# Altium footprint library Supernova Connectors.PcbLib: 303 footprints (part 6 of 19)
Each footprint in its own frame and in the unit in brackets; x right, y up, seen from the top. Pads: shape width x height; smd on the part's side, far side on the other; paste and mask are expansions set on the pad; w line width, h text height; cw(c..) or ccw(c..) is an arc to the next point about the centre after c.
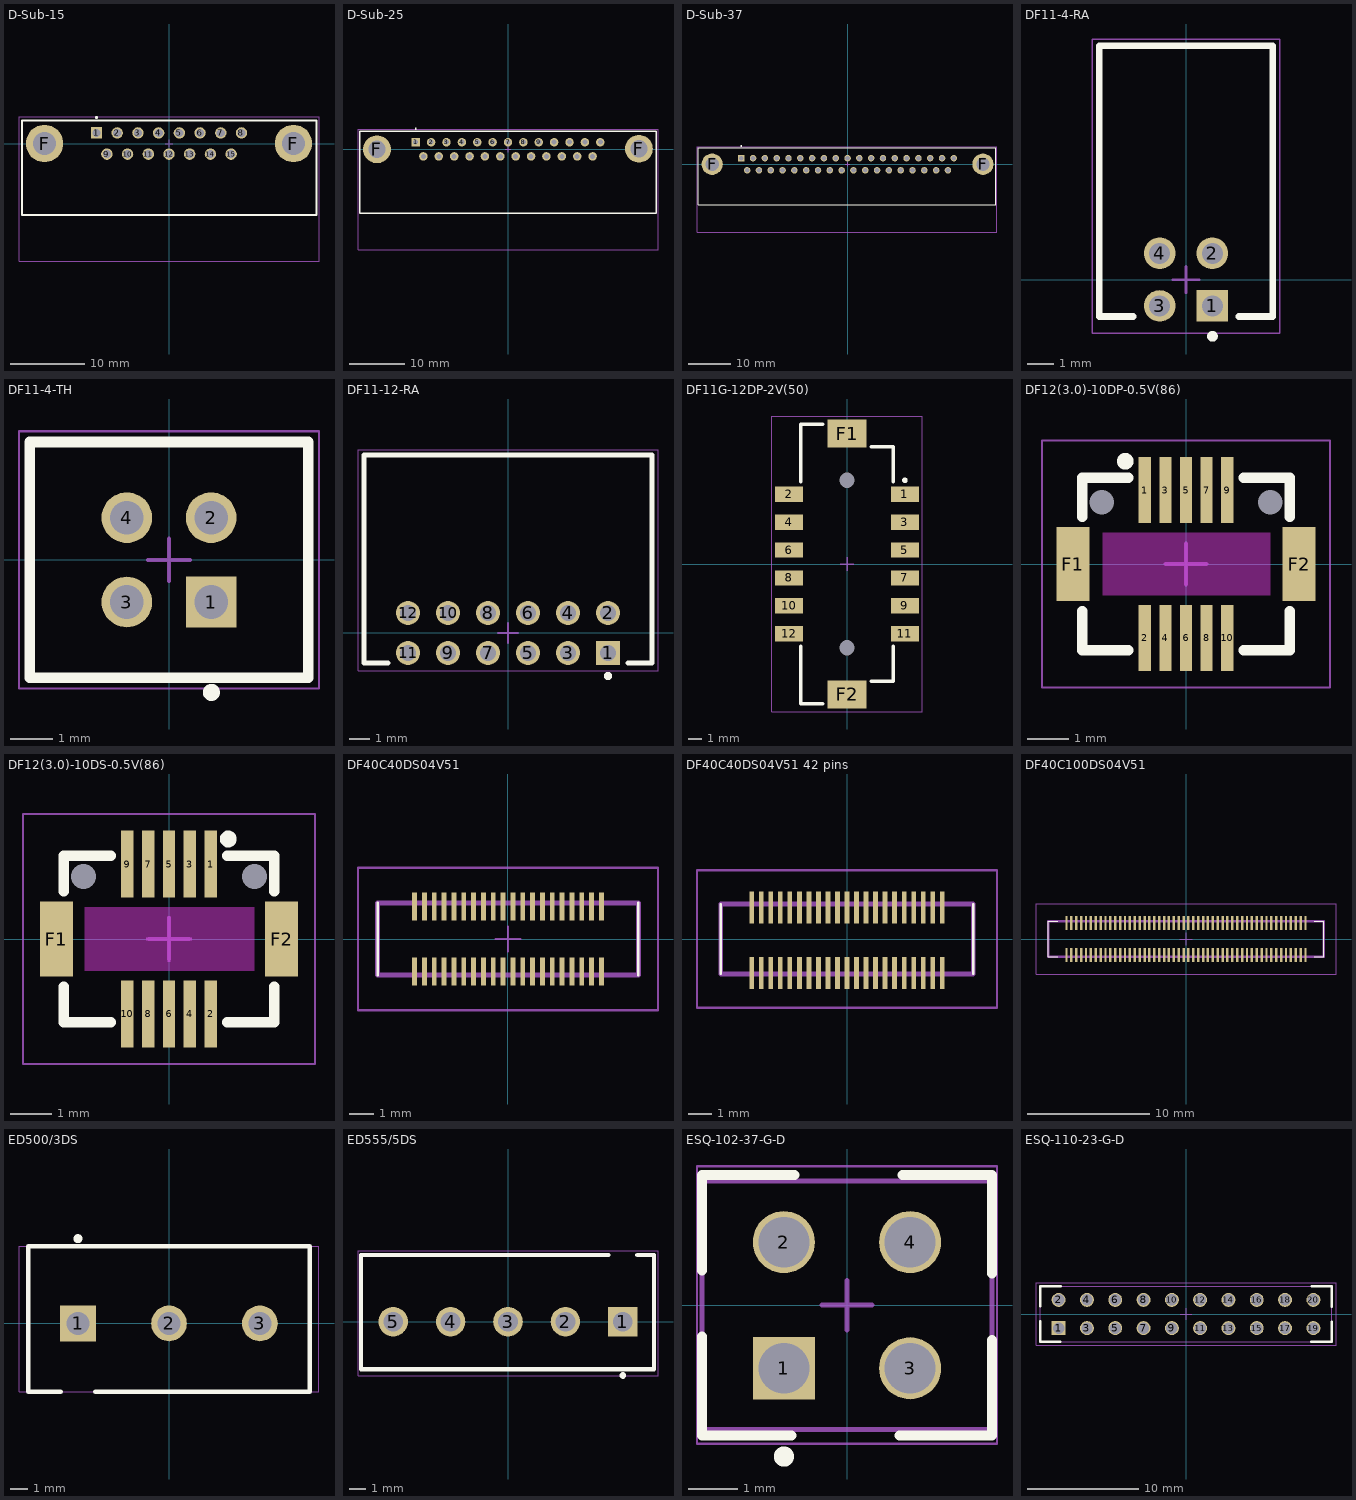
[diagram p5: the footprints below, top view; thin cyan lines are the x and y axes]

## D-Sub-15 [mm]
pads (17):
  rect 1.524x1.524 hole 1.1: 1(-9.695,1.42)
  round 1.524 hole 1.1: 2(-6.925,1.42) 3(-4.155,1.42) 4(-1.385,1.42) 5(1.385,1.42) 6(4.155,1.42) 7(6.925,1.42) 8(9.695,1.42) 9(-8.31,-1.42) 10(-5.54,-1.42) 11(-2.77,-1.42) 12(0,-1.42) 13(2.77,-1.42) 14(5.54,-1.42) 15(8.31,-1.42)
  round 5 hole 3.1: F(-16.65,0) F(16.65,0)
Top Overlay:
  circle w0.203: c-9.695,3.478 r0.102
  lines w0.254: -19.69,-9.55 -19.69,3.073 19.71,3.073 19.71,-9.55 -19.69,-9.55
Top Courtyard:
  lines w0.05: -20.066,-15.748 20.066,-15.748 20.066,3.556 -20.066,3.556 -20.066,-15.748
  lines w0.1: -0.5,0 0.5,0 ; 0,-0.5 0,0.5
3D body "182-015-113.STEP": height 12.55, standoff -3.17, extent -19.557,-15.545 19.585,2.946

## D-Sub-25 [mm]
pads (27):
  rect 1.524x1.524 hole 0.9: 1(-16.56,1.27)
  round 1.524 hole 0.9: 2(-13.8,1.27) 3(-11.04,1.27) 4(-8.28,1.27) 5(-5.52,1.27) 6(-2.76,1.27) 7(0,1.27) 8(2.76,1.27) 9(5.52,1.27) 10(8.28,1.27) 11(11.04,1.27) 12(13.8,1.27) 13(16.56,1.27) 14(-15.18,-1.27) 15(-12.42,-1.27) 16(-9.66,-1.27) 17(-6.9,-1.27) 18(-4.14,-1.27) 19(-1.38,-1.27) 20(1.38,-1.27) 21(4.14,-1.27) 22(6.9,-1.27) 23(9.66,-1.27) 24(12.42,-1.27) 25(15.18,-1.27)
  round 5 hole 3.1: F(-23.52,0) F(23.5,0.1)
Top Overlay:
  circle w0.203: c-16.56,3.678 r0.102
  lines w0.254: -26.6,-11.5 26.6,-11.5 26.6,3.2 -26.6,3.2 -26.6,-11.5
Top Courtyard:
  lines w0.05: -26.924,-18.034 -26.924,3.556 26.924,3.556 26.924,-18.034 -26.924,-18.034
  lines w0.1: -0.5,0 0.5,0 ; 0,-0.5 0,0.5
3D body "sd25p13a4gv00lf.stp": height 13.55, standoff -3.1, extent -26.52,-17.75 26.52,3.15

## D-Sub-37 [mm]
pads (39):
  rect 1.524x1.524 hole 1.1: 1(-24.93,1.42)
  round 1.524 hole 1.1: 2(-22.16,1.42) 3(-19.39,1.42) 4(-16.62,1.42) 5(-13.85,1.42) 6(-11.08,1.42) 7(-8.31,1.42) 8(-5.54,1.42) 9(-2.77,1.42) 10(0,1.42) 11(2.77,1.42) 12(5.54,1.42) 13(8.31,1.42) 14(11.08,1.42) 15(13.85,1.42) 16(16.62,1.42) 17(19.39,1.42) 18(22.16,1.42) 19(24.93,1.42) 20(-23.545,-1.42) 21(-20.775,-1.42) 22(-18.005,-1.42) 23(-15.235,-1.42) 24(-12.465,-1.42) 25(-9.695,-1.42) 26(-6.925,-1.42) 27(-4.155,-1.42) 28(-1.385,-1.42) 29(1.385,-1.42) 30(4.155,-1.42) 31(6.925,-1.42) 32(9.695,-1.42) 33(12.465,-1.42) 34(15.235,-1.42) 35(18.005,-1.42) 36(20.775,-1.42) 37(23.545,-1.42)
  round 5 hole 3.1: F(-31.75,0) F(31.75,0)
Top Overlay:
  circle w0.203: c-24.93,4.278 r0.102
  lines w0.254: 34.773,-9.55 -35.052,-9.55 -35.052,3.81 34.81,3.81 34.81,-9.55
Top Courtyard:
  lines w0.05: -35.306,-16.002 -35.306,4.064 35.052,4.064 35.052,-16.002 -35.306,-16.002
  lines w0.1: -0.5,0 0.5,0 ; 0,-0.5 0,0.5
3D body "182-037-113.STEP": height 12.55, standoff -3.17, extent -34.792,-15.697 34.525,3.454

## DF11-4-RA [mm]
pads (4):
  rect 1.2x1.2 hole 0.8: 1(1,-1)
  round 1.2 hole 0.8: 2(1,1) 3(-1,-1) 4(-1,1)
Top Overlay:
  circle w0.203: c1.004,-2.156 r0.102
  lines w0.254: -2,-1.4 -3.302,-1.4 -3.302,8.89 3.302,8.89 3.302,-1.4 2,-1.4
Top Courtyard:
  lines w0.05: -3.556,-2.032 3.556,-2.032 3.556,9.144 -3.556,9.144 -3.556,-2.032
  lines w0.1: -0.5,0 0.5,0 ; 0,-0.5 0,0.5
3D body "DF11-4DP-2DS_X_8A_S_H_X_97_S__.STEP": height 5.01, standoff -2.99, extent -3.025,-1.3 2.975,8.7

## DF11-4-TH [mm]
pads (4):
  rect 1.2x1.2 hole 0.8: 1(1,-1)
  round 1.2 hole 0.8: 2(1,1) 3(-1,-1) 4(-1,1)
Top Overlay:
  circle w0.203: c1.005,-3.143 r0.102
  lines w0.254: -3.302,-2.794 -1.706,-2.794 3.302,-2.794 3.302,2.794 -3.302,2.794 -3.302,-2.794
Top Courtyard:
  lines w0.05: -3.556,-3.048 -3.556,3.048 3.556,3.048 3.556,-3.048 -3.556,-3.048
  lines w0.1: -0.5,0 0.5,0 ; 0,-0.5 0,0.5
3D body "DF11-4DP-2DSA.stp": height 6.63, standoff -2.97, extent -3,-2.5 3,2.5

## DF11-12-RA [mm]
pads (12):
  rect 1.2x1.2 hole 0.8: 1(5,-1)
  round 1.2 hole 0.8: 2(5,1) 3(3,-1) 4(3,1) 5(1,-1) 6(1,1) 7(-1,-1) 8(-1,1) 9(-3,-1) 10(-3,1) 11(-5,-1) 12(-5,1)
Top Overlay:
  circle w0.203: c5.004,-2.156 r0.102
  lines w0.254: -6,-1.5 -7.2,-1.5 -7.2,8.89 7.2,8.89 7.2,-1.5 6,-1.5
Top Courtyard:
  lines w0.05: -7.5,-1.9 7.5,-1.9 7.5,9.144 -7.5,9.144 -7.5,-1.9
  lines w0.1: -0.5,0 0.5,0 ; 0,-0.5 0,0.5
3D body "DF11-12DP-2DS.stp": height 5.06, standoff -2.94, extent -7,-1.325 7,8.675

## DF11G-12DP-2V(50) [mm]
pads (16):
  rect 2x1.1 smd: 1(4.15,5) 2(-4.15,5) 3(4.15,3) 4(-4.15,3) 5(4.15,1) 6(-4.15,1) 7(4.15,-1) 8(-4.15,-1) 9(4.15,-3) 10(-4.15,-3) 11(4.15,-5) 12(-4.15,-5)
  rect 2.8x2 smd paste-0.2: F1(0,9.35) F2(0,-9.35)
  round 0 hole 1.1 unplated: ""(0,-6) ""(0,6)
Top Overlay:
  circle w0.203: c4.15,6 r0.102
  lines w0.254: -3.3,-5.9 -3.3,-10 -1.75,-10 ; -3.3,5.9 -3.3,10 -1.75,10 ; 1.75,-8.4 3.3,-8.4 3.3,-5.9 ; 1.75,8.4 3.3,8.4 3.3,5.9
Top Courtyard:
  lines w0.05: -5.4,-10.6 -5.4,10.6 5.4,10.6 5.4,-10.6 -5.4,-10.6
  lines w0.1: -0.5,0 0.5,0 ; 0,-0.5 0,0.5
3D body "DF11G-12DP-2V.stp": height 7.21, standoff -0.99, extent -4.6,-9.85 4.6,9.85

## DF12(3.0)-10DP-0.5V(86) [mm]
pads (14):
  rect 0.3x1.6 smd paste-1 mask+0.025: 1(-1,1.8) 2(-1,-1.8) 3(-0.5,1.8) 4(-0.5,-1.8) 5(0,1.8) 6(0,-1.8) 7(0.5,1.8) 8(0.5,-1.8) 9(1,1.8) 10(1,-1.8)
  rect 0.8x1.8 smd paste-0.05 mask+0.025: F1(-2.75,0) F2(2.75,0)
  round 0.2 hole 0.6 unplated: ""(-2.05,1.5) ""(2.05,1.5)
Top Layer keep-out:
  rectangle: -2.032,-0.762 2.057,0.762
Top Overlay:
  circle w0.203: c-1.478,2.5 r0.102
  lines w0.254: -2.525,-1.15 -2.525,-2.1 -1.4,-2.1 ; -2.525,1.15 -2.525,2.1 -1.4,2.1 ; 1.4,-2.1 2.525,-2.1 2.525,-1.15 ; 1.4,2.1 2.525,2.1 2.525,1.15
Top Paste:
  region: 1.14,-1.4 0.86,-1.4 0.86,-2.6 1.14,-2.6
  region: 0.64,-1.4 0.36,-1.4 0.36,-2.6 0.64,-2.6
  region: 0.14,-1.4 -0.14,-1.4 -0.14,-2.6 0.14,-2.6
  region: -0.36,-1.4 -0.64,-1.4 -0.64,-2.6 -0.36,-2.6
  region: -0.86,-1.4 -1.14,-1.4 -1.14,-2.6 -0.86,-2.6
  rectangle: -1.14,1.4 -0.86,2.6
  rectangle: -0.64,1.4 -0.36,2.6
  rectangle: 0.86,1.4 1.14,2.6
  rectangle: 0.36,1.4 0.64,2.6
  rectangle: -0.14,1.4 0.14,2.6
Top Courtyard:
  lines w0.05: -3.5,-3 -3.5,3 3.5,3 3.5,-3 -3.5,-3
  lines w0.1: -0.5,0 0.5,0 ; 0,-0.5 0,0.5
3D body "DF12(3.0)-10DP-0.5V.stp": height 2.3, standoff -0.6, extent -2.8,-2.289 2.8,2.311

## DF12(3.0)-10DS-0.5V(86) [mm]
pads (14):
  rect 0.3x1.6 smd paste-1 mask+0.025: 1(1,1.8) 2(1,-1.8) 3(0.5,1.8) 4(0.5,-1.8) 5(0,1.8) 6(0,-1.8) 7(-0.5,1.8) 8(-0.5,-1.8) 9(-1,1.8) 10(-1,-1.8)
  rect 0.8x1.8 smd paste-0.05 mask+0.025: F1(-2.7,0) F2(2.7,0)
  round 0.2 hole 0.6 unplated: ""(-2.05,1.5) ""(2.05,1.5)
Top Layer keep-out:
  rectangle: -2.032,-0.762 2.057,0.762
Top Overlay:
  circle w0.203: c1.422,2.4 r0.102
  lines w0.254: -2.525,-1.15 -2.525,-2 -1.4,-2 ; -2.525,1.15 -2.525,2 -1.4,2 ; 1.4,-2 2.525,-2 2.525,-1.15 ; 1.4,2 2.525,2 2.525,1.15
Top Paste:
  region: 0.14,2.6 -0.14,2.6 -0.14,1.4 0.14,1.4
  region: -0.36,2.6 -0.64,2.6 -0.64,1.4 -0.36,1.4
  region: -0.86,2.6 -1.14,2.6 -1.14,1.4 -0.86,1.4
  region: 0.64,2.6 0.36,2.6 0.36,1.4 0.64,1.4
  region: 1.14,2.6 0.86,2.6 0.86,1.4 1.14,1.4
  rectangle: 0.86,-2.6 1.14,-1.4
  rectangle: 0.36,-2.6 0.64,-1.4
  rectangle: -0.14,-2.6 0.14,-1.4
  rectangle: -0.64,-2.6 -0.36,-1.4
  rectangle: -1.14,-2.6 -0.86,-1.4
Top Courtyard:
  lines w0.05: -3.5,-3 3.5,-3 3.5,3 -3.5,3 -3.5,-3
  lines w0.1: -0.5,0 0.5,0 ; 0,-0.5 0,0.5
3D body "DF12(3.0)-10DS-0.5V.stp": height 2.2, standoff -0.6, extent -2.8,-2.3 2.8,2.3

## DF40C40DS04V51 [mm]
pads (40):
  rect 0.2x1.14 smd mask+0.025: 1(-3.8,-1.32) 2(-3.8,1.32) 3(-3.4,-1.32) 4(-3.4,1.32) 5(-3,-1.32) 6(-3,1.32) 7(-2.6,-1.32) 8(-2.6,1.32) 9(-2.2,-1.32) 10(-2.2,1.32) 11(-1.8,-1.32) 12(-1.8,1.32) 13(-1.4,-1.32) 14(-1.4,1.32) 15(-1,-1.32) 16(-1,1.32) 17(-0.6,-1.32) 18(-0.6,1.32) 19(-0.2,-1.32) 20(-0.2,1.32) 21(0.2,-1.32) 22(0.2,1.32) 23(0.6,-1.32) 24(0.6,1.32) 25(1,-1.32) 26(1,1.32) 27(1.4,-1.32) 28(1.4,1.32) 29(1.8,-1.32) 30(1.8,1.32) 31(2.2,-1.32) 32(2.2,1.32) 33(2.6,-1.32) 34(2.6,1.32) 35(3,-1.32) 36(3,1.32) 37(3.4,-1.32) 38(3.4,1.32) 39(3.8,-1.32) 40(3.8,1.32)
Top Overlay:
  lines w0.1: -5.3,-1.47 -5.3,1.47 ; 5.3,-1.47 5.3,1.47
Top 3D Body:
  lines w0.2: -5.3,-1.47 5.3,-1.47 5.3,1.47 -5.3,1.47 -5.3,-1.47
Top Courtyard:
  lines w0.1: -0.5,0 0.5,0 ; 0,-0.5 0,0.5 ; -6.1,-2.89 6.1,-2.89 6.1,2.89 -6.1,2.89 -6.1,-2.89
3D body "DF40C-40DS.stp": height 1.4, standoff -0.05, extent -5.315,-1.69 5.285,1.69

## DF40C40DS04V51 42 pins [mm]
pads (42):
  rect 0.2x1.34 smd mask+0.025: 1(-4,-1.42) 2(-4,1.32) 3(-3.6,-1.42) 4(-3.6,1.32) 5(-3.2,-1.42) 6(-3.2,1.32) 7(-2.8,-1.42) 8(-2.8,1.32) 9(-2.4,-1.42) 10(-2.4,1.32) 11(-2,-1.42) 12(-2,1.32) 13(-1.6,-1.42) 14(-1.6,1.32) 15(-1.2,-1.42) 16(-1.2,1.32) 17(-0.8,-1.42) 18(-0.8,1.32) 19(-0.4,-1.42) 20(-0.4,1.32) 21(0,-1.42) 22(0,1.32) 23(0.4,-1.42) 24(0.4,1.32) 25(0.8,-1.42) 26(0.8,1.32) 27(1.2,-1.42) 28(1.2,1.32) 29(1.6,-1.42) 30(1.6,1.32) 31(2,-1.42) 32(2,1.32) 33(2.4,-1.42) 34(2.4,1.32) 35(2.8,-1.42) 36(2.8,1.32) 37(3.2,-1.42) 38(3.2,1.32) 39(3.6,-1.42) 40(3.6,1.32) 41(4,-1.42) 42(4,1.32)
Top Overlay:
  lines w0.1: -5.3,-1.47 -5.3,1.47 ; 5.3,-1.47 5.3,1.47
Top 3D Body:
  lines w0.2: -5.3,-1.47 -5.3,1.47 5.3,1.47 5.3,-1.47 -5.3,-1.47
Top Courtyard:
  lines w0.1: -6.3,-2.89 -6.3,2.89 6.3,2.89 6.3,-2.89 -6.3,-2.89
3D body "DF40C-40DS-0.4V_51_.stp": height 1.75, standoff 0, extent -5.3,-1.87 5.3,1.87

## DF40C100DS04V51 [mm]
pads (100):
  rect 0.2x1.14 smd mask+0.025: 1(-9.8,-1.32) 2(-9.8,1.32) 3(-9.4,-1.32) 4(-9.4,1.32) 5(-9,-1.32) 6(-9,1.32) 7(-8.6,-1.32) 8(-8.6,1.32) 9(-8.2,-1.32) 10(-8.2,1.32) 11(-7.8,-1.32) 12(-7.8,1.32) 13(-7.4,-1.32) 14(-7.4,1.32) 15(-7,-1.32) 16(-7,1.32) 17(-6.6,-1.32) 18(-6.6,1.32) 19(-6.2,-1.32) 20(-6.2,1.32) 21(-5.8,-1.32) 22(-5.8,1.32) 23(-5.4,-1.32) 24(-5.4,1.32) 25(-5,-1.32) 26(-5,1.32) 27(-4.6,-1.32) 28(-4.6,1.32) 29(-4.2,-1.32) 30(-4.2,1.32) 31(-3.8,-1.32) 32(-3.8,1.32) 33(-3.4,-1.32) 34(-3.4,1.32) 35(-3,-1.32) 36(-3,1.32) 37(-2.6,-1.32) 38(-2.6,1.32) 39(-2.2,-1.32) 40(-2.2,1.32) 41(-1.8,-1.32) 42(-1.8,1.32) 43(-1.4,-1.32) 44(-1.4,1.32) 45(-1,-1.32) 46(-1,1.32) 47(-0.6,-1.32) 48(-0.6,1.32) 49(-0.2,-1.32) 50(-0.2,1.32) 51(0.2,-1.32) 52(0.2,1.32) 53(0.6,-1.32) 54(0.6,1.32) 55(1,-1.32) 56(1,1.32) 57(1.4,-1.32) 58(1.4,1.32) 59(1.8,-1.32) 60(1.8,1.32) 61(2.2,-1.32) 62(2.2,1.32) 63(2.6,-1.32) 64(2.6,1.32) 65(3,-1.32) 66(3,1.32) 67(3.4,-1.32) 68(3.4,1.32) 69(3.8,-1.32) 70(3.8,1.32) 71(4.2,-1.32) 72(4.2,1.32) 73(4.6,-1.32) 74(4.6,1.32) 75(5,-1.32) 76(5,1.32) 77(5.4,-1.32) 78(5.4,1.32) 79(5.8,-1.32) 80(5.8,1.32) 81(6.2,-1.32) 82(6.2,1.32) 83(6.6,-1.32) 84(6.6,1.32) 85(7,-1.32) 86(7,1.32) 87(7.4,-1.32) 88(7.4,1.32) 89(7.8,-1.32) 90(7.8,1.32) 91(8.2,-1.32) 92(8.2,1.32) 93(8.6,-1.32) 94(8.6,1.32) 95(9,-1.32) 96(9,1.32) 97(9.4,-1.32) 98(9.4,1.32) 99(9.8,-1.32) 100(9.8,1.32)
Top Overlay:
  lines w0.1: -10.5,-1.44 -11.3,-1.44 -11.3,1.44 -10.5,1.44 ; 10.5,-1.44 11.3,-1.44 11.3,1.44 10.5,1.44
Top 3D Body:
  lines w0.2: -11.3,-1.44 -11.3,1.44 11.3,1.44 11.3,-1.44 -11.3,-1.44
Top Courtyard:
  lines w0.1: -0.5,0 0.5,0 ; 0,-0.5 0,0.5 ; -12.3,-2.89 -12.3,2.89 12.3,2.89 12.3,-2.89 -12.3,-2.89
3D body "DF40C-100DS-0.4V_51_.stp": height 1.45, standoff -0.05, extent -11.3,-1.69 11.3,1.69

## ED500/3DS [mm]
pads (3):
  rect 2x2 hole 1.3: 1(-5.08,0)
  round 2 hole 1.3: 2(0,0) 3(5.08,0)
Top Overlay:
  circle w0.254: c-5.087,4.734 r0.127
  lines w0.254: -6.045,-3.81 -7.874,-3.81 -7.874,4.318 -2.102,4.318 7.874,4.318 7.874,-3.81 -4.115,-3.81
Top Courtyard:
  lines w0.05: -8.382,-3.81 8.382,-3.81 8.382,4.318 -8.382,4.318 -8.382,-3.81
  lines w0.1: -0.5,0 0.5,0 ; 0,-0.5 0,0.5
3D body "EDZ500_3DS.STP": height 10, standoff -4.5, extent -8.309,-3.501 7.631,3.999

## ED555/5DS [mm]
pads (5):
  rect 1.8x1.8 hole 1.2: 1(7,0)
  round 1.8 hole 1.2: 2(3.5,0) 3(0,0) 4(-3.5,0) 5(-7,0)
Top Overlay:
  circle w0.203: c7,-3.278 r0.102
  lines w0.254: 6.126,4.074 -7.426,4.074 -8.954,4.074 -8.954,-2.9 8.9,-2.9 8.9,4.074 7.874,4.074
Top Courtyard:
  lines w0.05: -9.144,-3.302 -9.144,4.318 9.144,4.318 9.144,-3.302 -9.144,-3.302
  lines w0.1: -0.5,0 0.5,0 ; 0,-0.5 0,0.5
3D body "ED555-5DS.stp": height 8.25, standoff -3.5, extent -8.75,-2.7 8.75,3.85

## ESQ-102-37-G-D [mm] "ESQ-102-37-G-D"
height 11.05
pads (4):
  rect 1.25x1.25 hole 1.02: 1(-1.27,-1.27)
  round 1.25 hole 1.02: 2(-1.27,1.27) 3(1.27,-1.27) 4(1.27,1.27)
Top Overlay:
  circle w0.203: c-1.27,-3.048 r0.102
  lines w0.2: -2.92,-0.635 -2.92,-2.624 -1.12,-2.624 ; -2.92,0.7 -2.92,2.622 -1.055,2.622 ; 1.055,-2.624 2.92,-2.624 2.92,-0.7 ; 1.12,2.622 2.92,2.622 2.92,0.635
Top 3D Body:
  lines w0.1: -2.921,-2.5 2.92,-2.5 2.92,2.5 -2.921,2.5 ; -2.92,-2.5 -2.92,2.5
Top Courtyard:
  lines w0.05: -3.02,-2.794 3.02,-2.794 3.02,2.794 -3.02,2.794 -3.02,-2.794
  lines w0.1: -0.5,0 0.5,0 ; 0,-0.5 0,0.5
3D body "ESQ-102-37-G-D.stp": height 11.07, standoff -2.27, extent -2.794,-2.54 2.794,2.54

## ESQ-110-23-G-D [mm] "ESQ-126-37-G-D Samtech 52-pin connector"
height 11.05
pads (20):
  rect 1.25x1.25 hole 1.02: 1(-11.43,-1.27)
  round 1.25 hole 1.02: 2(-11.43,1.27) 3(-8.89,-1.27) 4(-8.89,1.27) 5(-6.35,-1.27) 6(-6.35,1.27) 7(-3.81,-1.27) 8(-3.81,1.27) 9(-1.27,-1.27) 10(-1.27,1.27) 11(1.27,-1.27) 12(1.27,1.27) 13(3.81,-1.27) 14(3.81,1.27) 15(6.35,-1.27) 16(6.35,1.27) 17(8.89,-1.27) 18(8.89,1.27) 19(11.43,-1.27) 20(11.43,1.27)
Top Overlay:
  lines w0.2: -13.08,-0.635 -13.08,-2.5 -11.28,-2.5 ; -13.08,0.7 -13.08,2.5 -11.215,2.5 ; 11.215,-2.5 13.08,-2.5 13.08,-0.7 ; 11.28,2.5 13.08,2.5 13.08,0.635
Top 3D Body:
  lines w0.1: -13.081,-2.5 13.08,-2.5 13.08,2.5 -13.081,2.5 ; -13.08,-2.5 -13.08,2.5
Top Courtyard:
  lines w0.05: -13.462,-2.794 13.462,-2.794 13.462,2.794 -13.462,2.794 -13.462,-2.794
  lines w0.1: -0.5,0 0.5,0 ; 0,-0.5 0,0.5
3D body "ESQ-110-23-G-D.stp": height 13.59, standoff -4.83, extent -12.954,-2.54 12.954,2.54